# Altium footprint library mypcblib.PcbLib: 124 footprints (part 1 of 8)
Each footprint in its own frame and in the unit in brackets; x right, y up, seen from the top. Pads: shape width x height; smd on the part's side, far side on the other; paste and mask are expansions set on the pad; w line width, h text height; cw(c..) or ccw(c..) is an arc to the next point about the centre after c.
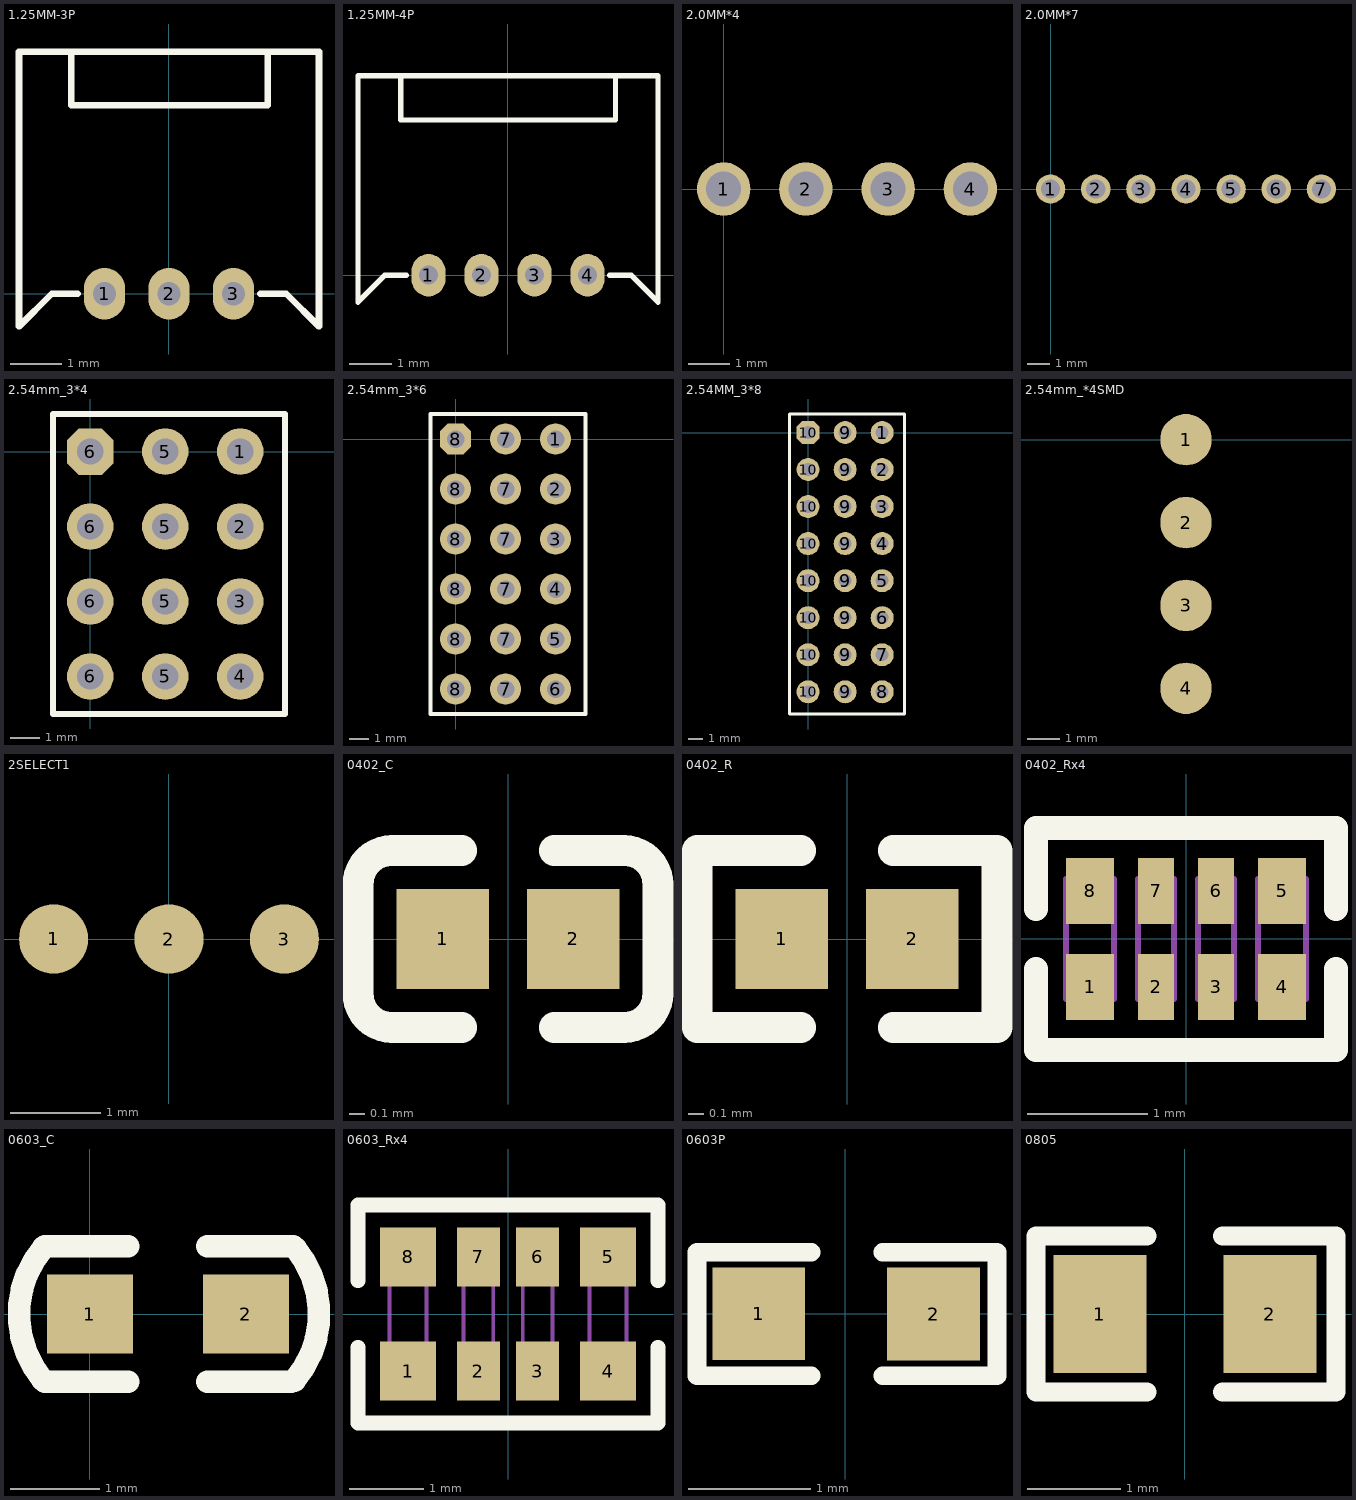
[diagram p0: the footprints below, top view; thin cyan lines are the x and y axes]

## 1.25MM-3P [mm]
pads (3):
  oval 0.8x1 hole 0.45: 1(-1.25,0) 2(0,0) 3(1.25,0)
Top Overlay:
  lines w0.127: -1.895,4.699 -1.895,3.658 1.92,3.658 1.92,4.699 ; -1.768,0 -2.276,0 -2.911,-0.635 -2.911,4.699 2.911,4.699 2.911,-0.635 2.276,0 1.768,0

## 1.25MM-4P [mm]
pads (4):
  oval 0.8x1 hole 0.45: 1(-1.875,0) 2(-0.625,0) 3(0.625,0) 4(1.875,0)
Top Overlay:
  lines w0.127: -2.53,4.699 -2.53,3.658 2.535,3.658 2.535,4.699 ; -2.393,0 -2.901,0 -3.536,-0.635 -3.536,4.699 3.536,4.699 3.536,-0.635 2.901,0 2.393,0

## 2.0MM*4 [mm]
pads (4):
  round 1.3 hole 0.85: 1(0,0) 2(2,0) 3(4,0) 4(6,0)

## 2.0MM*7 [mm]
pads (7):
  round 1.3 hole 0.85: 1(0,0) 2(2,0) 3(4,0) 4(6,0) 5(8,0) 6(10,0) 7(12,0)

## 2.54mm_3*4 [mil]
pads (12):
  round 62 hole 35: 1(200,0) 2(200,-100) 3(200,-200) 4(200,-300) 5(100,-300) 5(100,-200) 5(100,-100) 5(100,0) 6(0,-300) 6(0,-200) 6(0,-100)
  oct 62x62 hole 35: 6(0,0)
Top Overlay:
  lines w8: -50,-350 260,-350 260,50 -50,50 -50,-350

## 2.54mm_3*6 [mil]
pads (18):
  round 62 hole 35: 1(200,0) 2(200,-100) 3(200,-200) 4(200,-300) 5(200,-400) 6(200,-500) 7(100,-500) 7(100,-400) 7(100,-300) 7(100,-200) 7(100,-100) 7(100,0) 8(0,-500) 8(0,-400) 8(0,-300) 8(0,-200) 8(0,-100)
  oct 62x62 hole 35: 8(0,0)
Top Overlay:
  lines w8: -50,-550 -50,50 260,50 260,-550 -50,-550

## 2.54MM_3*8 [mil]
pads (24):
  round 62 hole 35: 1(200,0) 2(200,-100) 3(200,-200) 4(200,-300) 5(200,-400) 6(200,-500) 7(200,-600) 8(200,-700) 9(100,-700) 9(100,-600) 9(100,-500) 9(100,-400) 9(100,-300) 9(100,-200) 9(100,-100) 9(100,0) 10(0,-700) 10(0,-600) 10(0,-500) 10(0,-400) 10(0,-300) 10(0,-200) 10(0,-100)
  oct 62x62 hole 35: 10(0,0)
Top Overlay:
  lines w8: -50,-760 -50,50 260,50 260,-760 -50,-760

## 2.54mm_*4SMD [mil]
pads (4):
  round 62 smd: 1(200,0) 2(200,-100) 3(200,-200) 4(200,-300)

## 2SELECT1 [mil]
pads (3):
  round 30 smd: 1(-50,0) 2(0,0) 3(50,0)

## 0402_C [mm]
pads (2):
  rect 0.6x0.65 smd mask+0.051: 1(-0.425,0) 2(0.425,0)
Top Overlay:
  lines w0.2: -0.755,-0.575 cw(c-0.755,-0.355) -0.975,-0.355 -0.975,0.355 cw(c-0.755,0.355) -0.755,0.575 ; -0.75,-0.575 -0.3,-0.575 ; -0.75,0.575 -0.3,0.575 ; 0.3,-0.575 0.75,-0.575 ; 0.3,0.575 0.75,0.575 ; 0.755,-0.575 ccw(c0.755,-0.355) 0.975,-0.355 0.975,0.355 ccw(c0.755,0.355) 0.755,0.575
3D body "0402 SMD Capacitor.step": height 0.2, standoff 0, extent -0.483,-0.3 0.518,0.3

## 0402_R [mm]
pads (2):
  rect 0.6x0.65 smd mask+0.051: 1(-0.425,0) 2(0.425,0)
Top Overlay:
  lines w0.2: -0.3,-0.575 -0.975,-0.575 -0.975,0.575 -0.3,0.575 ; 0.3,-0.575 0.975,-0.575 0.975,0.575 0.3,0.575
3D body "User Library-RES_1005-0402.STEP": height 0.41, standoff 0, extent -0.575,-0.275 0.575,0.275

## 0402_Rx4 [mm]
pads (8):
  rect 0.4x0.55 smd mask+0.051: 1(-0.8,-0.4) 4(0.8,-0.4) 5(0.8,0.4) 8(-0.8,0.4)
  rect 0.3x0.55 smd mask+0.051: 2(-0.25,-0.4) 3(0.25,-0.4) 6(0.25,0.4) 7(-0.25,0.4)
Top Overlay:
  lines w0.2: -1.25,-0.25 -1.25,-0.925 1.25,-0.925 1.25,-0.25 ; -1.25,0.25 -1.25,0.925 1.25,0.925 1.25,0.25
Mechanical 13:
  lines w0.05: -1,-0.5 -0.6,-0.5 ; -1,-0.5 -1,0.5 -0.6,0.5 -0.6,-0.5 ; -1,-0.5 -0.6,-0.5 ; -0.4,-0.5 -0.4,0.5 -0.1,0.5 -0.1,-0.5 -0.4,-0.5 ; 0.1,-0.5 0.1,0.5 0.4,0.5 0.4,-0.5 0.1,-0.5 ; 0.6,-0.5 0.6,0.5 1,0.5 1,-0.5 0.6,-0.5
3D body "User Library-YC124-1.step": height 0.45, standoff 0, extent -1,-0.5 1,0.5

## 0603_C [mil]
pads (2):
  rect 38x35 smd: 1(0,0) 2(69,0)
Top Overlay:
  lines w10: -21,-29 cw(c14.45,-0.04) -20.48,29.56 ; -20,-30 17,-30 ; -20,30 17,30 ; 52,-30 89,-30 ; 52,30 90,30 ; 90.48,-29.56 ccw(c55.55,0.04) 91,29
3D body "User Library-0603 SMD Capacitor.STEP": height 11.89, standoff 0, extent 3.8,-15.8 66.8,15.7

## 0603_Rx4 [mm]
pads (8):
  rect 0.75x0.8 smd mask+0.051: 1(-1.35,-0.77) 4(1.35,-0.77) 5(1.35,0.77) 8(-1.35,0.77)
  rect 0.58x0.8 smd mask+0.051: 2(-0.4,-0.77) 3(0.4,-0.77) 6(0.4,0.77) 7(-0.4,0.77)
Top Overlay:
  lines w0.2: -2.025,-0.45 -2.025,-1.47 2.025,-1.47 2.025,-0.45 ; -2.025,0.45 -2.025,1.47 2.025,1.47 2.025,0.45
Mechanical 13:
  lines w0.05: -1.6,-0.8 -1.6,0.8 -1.1,0.8 -1.1,-0.8 -1.6,-0.8 ; -0.6,-0.8 -0.6,0.8 -0.2,0.8 -0.2,-0.8 -0.6,-0.8 ; 0.2,-0.8 0.2,0.8 0.6,0.8 0.6,-0.8 0.2,-0.8 ; 1.1,-0.8 1.1,0.8 1.6,0.8 1.6,-0.8 1.1,-0.8
3D body "SW3dPS-RN164P.STEP": height 0.55, standoff 0, extent -1.6,-0.8 1.6,0.8

## 0603P [mil]
pads (2):
  rect 30x30 smd: 1(-28,0) 2(28.5,-0.06)
Top Overlay:
  lines w6: -11,-20.06 -48,-20.06 -48,19.94 -11,19.94 ; 12,-20.06 49,-20.06 49,19.94 12,19.94

## 0805 [mm]
pads (2):
  rect 1x1.27 smd: 1(-0.914,0) 2(0.914,0)
Top Overlay:
  lines w0.203: -0.406,-0.838 -1.6,-0.838 -1.6,0.838 -0.406,0.838 ; 0.406,-0.838 1.626,-0.838 1.626,0.838 0.406,0.838